# Altium footprint library PCB_ConnectorHDR.PcbLib: 129 footprints (part 7 of 9)
Each footprint in its own frame and in the unit in brackets; x right, y up, seen from the top. Pads: shape width x height; smd on the part's side, far side on the other; paste and mask are expansions set on the pad; w line width, h text height; cw(c..) or ccw(c..) is an arc to the next point about the centre after c.
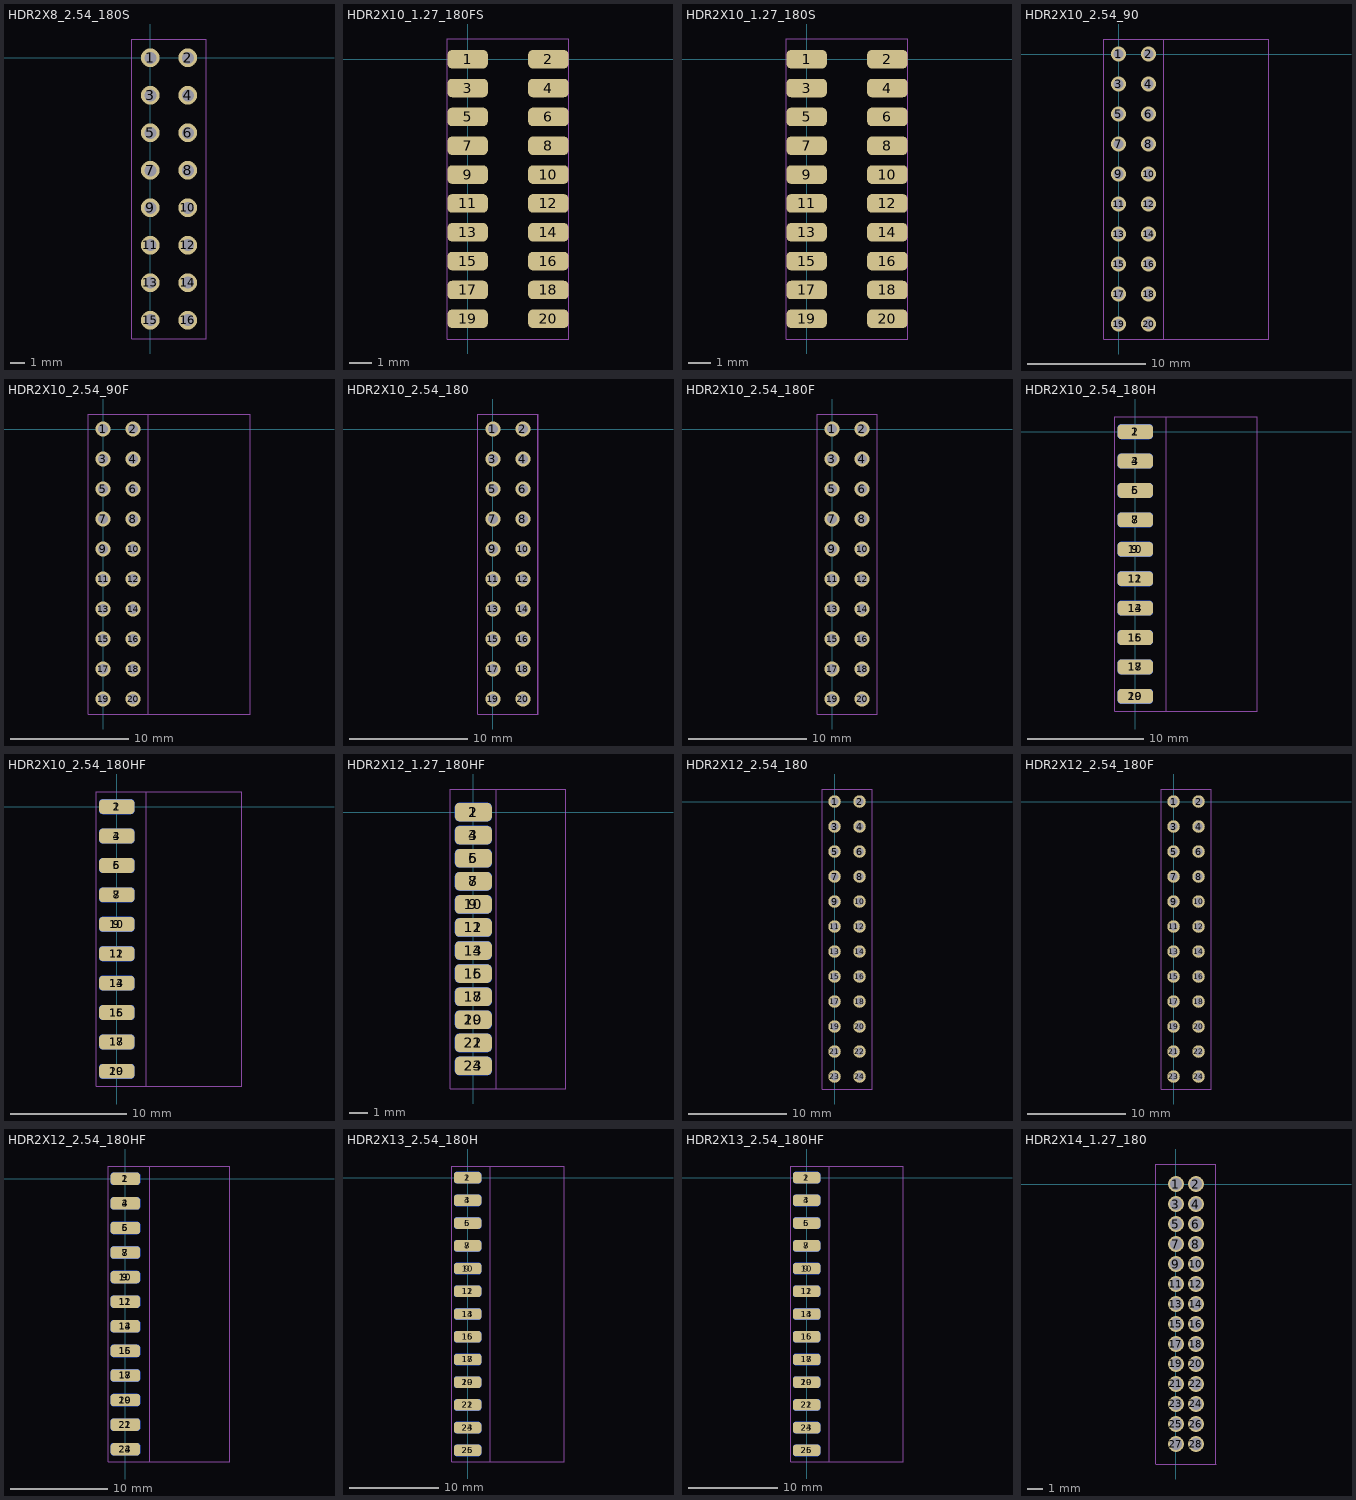
[diagram p6: the footprints below, top view; thin cyan lines are the x and y axes]

## HDR2X8_2.54_180S [mil]
height 169.29
pads (16):
  round 50 hole 32: 1(0,0) 2(100,0) 3(0,-100) 4(100,-100) 5(0,-200) 6(100,-200) 7(0,-300) 8(100,-300) 9(0,-400) 10(100,-400) 11(0,-500) 12(100,-500) 13(0,-600) 14(100,-600) 15(0,-700) 16(100,-700)
Mechanical 13:
  lines w2: -50,-750 -50,50 150,50 150,-750 -50,-750
T-Component:
  lines w2: -50,-750 -50,50 150,50 150,-750 -50,-750
  text ".Designator" at 10,-375 h50
3D body "pin_header_a-sl254-dg-g16mp1.stp": height 334.71, standoff -48.82, extent -97.64,-750 197.64,50

## HDR2X10_1.27_180FS [mil]
height 169.29
pads (20):
  rrect50% 70x32 smd: 1(0,0) 2(140,0) 3(0,-50) 4(140,-50) 5(0,-100) 6(140,-100) 7(0,-150) 8(140,-150) 9(0,-200) 10(140,-200) 11(0,-250) 12(140,-250) 13(0,-300) 14(140,-300) 15(0,-350) 16(140,-350) 17(0,-400) 18(140,-400) 19(0,-450) 20(140,-450)
Mechanical 13:
  lines w2: -35,-485 175,-485 175,35 -35,35 -35,-485
T-Component:
  lines w2: -35,-485 175,-485 175,35 -35,35 -35,-485
  text ".Designator" at 25,-250 h50
3D body "female_header_a-bl127-dg-g20mp1.stp": height 185.29, standoff 8.13, extent -20.54,-482.88 160.56,32.87

## HDR2X10_1.27_180S [mil]
height 169.29
pads (20):
  rrect50% 70x32 smd: 1(0,0) 2(140,0) 3(0,-50) 4(140,-50) 5(0,-100) 6(140,-100) 7(0,-150) 8(140,-150) 9(0,-200) 10(140,-200) 11(0,-250) 12(140,-250) 13(0,-300) 14(140,-300) 15(0,-350) 16(140,-350) 17(0,-400) 18(140,-400) 19(0,-450) 20(140,-450)
Mechanical 13:
  lines w2: -35,-485 -35,35 175,35 175,-485 -35,-485
T-Component:
  lines w2: -35,-485 -35,35 175,35 175,-485 -35,-485
  text ".Designator" at 25,-250 h50
3D body "pin_header_a-sl127-dg-g20mp1.stp": height 252.13, standoff 0.25, extent -38.31,-475 178.31,25

## HDR2X10_2.54_90 [mil]
height 169.29
pads (20):
  round 50 hole 32: 1(0,0) 2(100,0) 3(0,-100) 4(100,-100) 5(0,-200) 6(100,-200) 7(0,-300) 8(100,-300) 9(0,-400) 10(100,-400) 11(0,-500) 12(100,-500) 13(0,-600) 14(100,-600) 15(0,-700) 16(100,-700) 17(0,-800) 18(100,-800) 19(0,-900) 20(100,-900)
Mechanical 13:
  lines w2: -50,-950 500,-950 500,50 -50,50 -50,-950
T-Component:
  lines w2: -50,-950 -50,50 150,50 150,-950 -50,-950
  text ".Designator" at 10,-475 h50
3D body "pin_header_awl254-da-g20d.stp": height 198.43, standoff -116.54, extent -12.44,-950 494.65,50

## HDR2X10_2.54_90F [mil]
height 169.29
pads (20):
  round 50 hole 32: 1(0,0) 2(100,0) 3(0,-100) 4(100,-100) 5(0,-200) 6(100,-200) 7(0,-300) 8(100,-300) 9(0,-400) 10(100,-400) 11(0,-500) 12(100,-500) 13(0,-600) 14(100,-600) 15(0,-700) 16(100,-700) 17(0,-800) 18(100,-800) 19(0,-900) 20(100,-900)
Mechanical 13:
  lines w2: -50,-950 490,-950 490,50 -50,50 -50,-950
T-Component:
  lines w2: -50,-950 150,-950 150,50 -50,50 -50,-950
  text ".Designator" at 10,-475 h50
3D body "female_header_a-bl254-da-g20d.stp": height 198.43, standoff -124.41, extent -10,-954.92 486.06,54.92

## HDR2X10_2.54_180 [mil]
height 169.29
pads (20):
  round 50 hole 32: 1(0,0) 2(100,0) 3(0,-100) 4(100,-100) 5(0,-200) 6(100,-200) 7(0,-300) 8(100,-300) 9(0,-400) 10(100,-400) 11(0,-500) 12(100,-500) 13(0,-600) 14(100,-600) 15(0,-700) 16(100,-700) 17(0,-800) 18(100,-800) 19(0,-900) 20(100,-900)
Mechanical 13:
  lines w2: -50,-950 150,-950 150,50 -50,50 -50,-950
T-Component:
  lines w2: -50,-950 150,-950 150,50 -50,50 -50,-950
  text ".Designator" at 10,-475 h50
3D body "pin_header_awl254-dg-g20d.stp": height 334.65, standoff -118.11, extent -50,-950 150,50

## HDR2X10_2.54_180F [mil]
height 169.29
pads (20):
  round 50 hole 32: 1(0,0) 2(100,0) 3(0,-100) 4(100,-100) 5(0,-200) 6(100,-200) 7(0,-300) 8(100,-300) 9(0,-400) 10(100,-400) 11(0,-500) 12(100,-500) 13(0,-600) 14(100,-600) 15(0,-700) 16(100,-700) 17(0,-800) 18(100,-800) 19(0,-900) 20(100,-900)
Mechanical 13:
  lines w2: -50,-950 150,-950 150,50 -50,50 -50,-950
T-Component:
  lines w2: -50,-950 150,-950 150,50 -50,50 -50,-950
  text ".Designator" at 10,-475 h50
3D body "female_header_a-bl254-dg-g20d.stp": height 334.65, standoff -125.98, extent -48.42,-954.92 148.43,54.92

## HDR2X10_2.54_180H [mil]
height 169.29
pads (20):
  rrect50% 120x50 smd: 1(0,0) 3(0,-100) 5(0,-200) 7(0,-300) 9(0,-400) 11(0,-500) 13(0,-600) 15(0,-700) 17(0,-800) 19(0,-900)
  rrect50% 120x50 smd far side: 2(0,0) 4(0,-100) 6(0,-200) 8(0,-300) 10(0,-400) 12(0,-500) 14(0,-600) 16(0,-700) 18(0,-800) 20(0,-900)
Mechanical 13:
  lines w2: -70,-950 -70,50 415,50 415,-950 -70,-950
T-Component:
  lines w2: -70,-950 -70,50 105,50 105,-950 -70,-950
  text ".Designator" at -40,-475 h50
B-Component:
  lines w2: -70,-950 105,-950 105,50 -70,50 -70,-950
3D body "pin_header_awl254-dg-g20d.stp": height 100, standoff -100, extent -37.76,-950 415,50

## HDR2X10_2.54_180HF [mil]
height 169.29
pads (20):
  rrect50% 120x50 smd: 1(0,0) 3(0,-100) 5(0,-200) 7(0,-300) 9(0,-400) 11(0,-500) 13(0,-600) 15(0,-700) 17(0,-800) 19(0,-900)
  rrect50% 120x50 smd far side: 2(0,0) 4(0,-100) 6(0,-200) 8(0,-300) 10(0,-400) 12(0,-500) 14(0,-600) 16(0,-700) 18(0,-800) 20(0,-900)
Mechanical 13:
  lines w2: -70,-950 -70,50 425,50 425,-950 -70,-950
T-Component:
  lines w2: -70,-950 -70,50 100,50 100,-950 -70,-950
  text ".Designator" at -35,-475 h50
B-Component:
  lines w2: -70,-950 100,-950 100,50 -70,50 -70,-950
3D body "female_header_a-bl254-dg-g20d.stp": height 76.43, standoff -120.43, extent -40.98,-954.92 419.65,54.92

## HDR2X12_1.27_180HF [mil]
height 169.29
pads (24):
  rrect50% 80x40 smd: 1(0,0) 3(0,-50) 5(0,-100) 7(0,-150) 9(0,-200) 11(0,-250) 13(0,-300) 15(0,-350) 17(0,-400) 19(0,-450) 21(0,-500) 23(0,-550)
  rrect50% 80x40 smd far side: 2(0,0) 4(0,-50) 6(0,-100) 8(0,-150) 10(0,-200) 12(0,-250) 14(0,-300) 16(0,-350) 18(0,-400) 20(0,-450) 22(0,-500) 24(0,-550)
Mechanical 13:
  lines w2: -50,-600 -50,50 200,50 200,-600 -50,-600
T-Component:
  lines w2: -50,-600 -50,50 50,50 50,-600 -50,-600
  text ".Designator" at -40,-300 h50
3D body "female_header_a-bl127-dg-g24d.stp": height 39.02, standoff -83.02, extent -28.34,-582.88 200,32.87

## HDR2X12_2.54_180 [mil]
height 169.29
pads (24):
  round 50 hole 32: 1(0,0) 2(100,0) 3(0,-100) 4(100,-100) 5(0,-200) 6(100,-200) 7(0,-300) 8(100,-300) 9(0,-400) 10(100,-400) 11(0,-500) 12(100,-500) 13(0,-600) 14(100,-600) 15(0,-700) 16(100,-700) 17(0,-800) 18(100,-800) 19(0,-900) 20(100,-900) 21(0,-1000) 22(100,-1000) 23(0,-1100) 24(100,-1100)
Mechanical 13:
  lines w2: -50,-1150 150,-1150 150,50 -50,50 -50,-1150
T-Component:
  lines w2: -50,-1150 -50,50 150,50 150,-1150 -50,-1150
  text ".Designator" at 10,-575 h50
3D body "pin_header_awl254-dg-g24d.stp": height 334.65, standoff -118.11, extent -50,-1149.99 150,50.01

## HDR2X12_2.54_180F [mil]
height 169.29
pads (24):
  round 50 hole 32: 1(0,0) 2(100,0) 3(0,-100) 4(100,-100) 5(0,-200) 6(100,-200) 7(0,-300) 8(100,-300) 9(0,-400) 10(100,-400) 11(0,-500) 12(100,-500) 13(0,-600) 14(100,-600) 15(0,-700) 16(100,-700) 17(0,-800) 18(100,-800) 19(0,-900) 20(100,-900) 21(0,-1000) 22(100,-1000) 23(0,-1100) 24(100,-1100)
Mechanical 13:
  lines w2: -50,-1150 150,-1150 150,50 -50,50 -50,-1150
T-Component:
  lines w2: -50,-1150 -50,50 150,50 150,-1150 -50,-1150
  text ".Designator" at 10,-575 h50
3D body "female_header_a-bl254-dg-g24d.stp": height 334.65, standoff -125.98, extent -48.43,-1154.92 148.42,54.92

## HDR2X12_2.54_180HF [mil]
height 169.29
pads (24):
  rrect50% 120x50 smd: 1(0,0) 3(0,-100) 5(0,-200) 7(0,-300) 9(0,-400) 11(0,-500) 13(0,-600) 15(0,-700) 17(0,-800) 19(0,-900) 21(0,-1000) 23(0,-1100)
  rrect50% 120x50 smd far side: 2(0,0) 4(0,-100) 6(0,-200) 8(0,-300) 10(0,-400) 12(0,-500) 14(0,-600) 16(0,-700) 18(0,-800) 20(0,-900) 22(0,-1000) 24(0,-1100)
Mechanical 13:
  lines w2: -70,-1150 425,-1150 425,50 -70,50 -70,-1150
T-Component:
  lines w2: -70,-1150 100,-1150 100,50 -70,50 -70,-1150
  text ".Designator" at -40,-575 h50
B-Component:
  lines w2: -70,-1150 -70,50 100,50 100,-1150 -70,-1150
3D body "female_header_a-bl254-dg-g24d.stp": height 76.43, standoff -120.43, extent -35.97,-1154.92 424.66,54.92

## HDR2X13_2.54_180H [mil]
height 169.29
pads (26):
  rrect50% 120x50 smd: 1(0,0) 3(0,-100) 5(0,-200) 7(0,-300) 9(0,-400) 11(0,-500) 13(0,-600) 15(0,-700) 17(0,-800) 19(0,-900) 21(0,-1000) 23(0,-1100) 25(0,-1200)
  rrect50% 120x50 smd far side: 2(0,0) 4(0,-100) 6(0,-200) 8(0,-300) 10(0,-400) 12(0,-500) 14(0,-600) 16(0,-700) 18(0,-800) 20(0,-900) 22(0,-1000) 24(0,-1100) 26(0,-1200)
Mechanical 13:
  lines w2: -70,-1250 -70,50 425,50 425,-1250 -70,-1250
T-Component:
  lines w2: -70,-1250 -70,50 100,50 100,-1250 -70,-1250
  text ".Designator" at -40,-625 h50
B-Component:
  lines w2: -70,-1250 -70,50 100,50 100,-1250 -70,-1250
3D body "pin_header_awl254-dg-g26d.stp": height 100, standoff -100, extent -36.38,-1250 416.38,50

## HDR2X13_2.54_180HF [mil]
height 169.29
pads (26):
  rrect50% 120x50 smd: 1(0,0) 3(0,-100) 5(0,-200) 7(0,-300) 9(0,-400) 11(0,-500) 13(0,-600) 15(0,-700) 17(0,-800) 19(0,-900) 21(0,-1000) 23(0,-1100) 25(0,-1200)
  rrect50% 120x50 smd far side: 2(0,0) 4(0,-100) 6(0,-200) 8(0,-300) 10(0,-400) 12(0,-500) 14(0,-600) 16(0,-700) 18(0,-800) 20(0,-900) 22(0,-1000) 24(0,-1100) 26(0,-1200)
Mechanical 13:
  lines w2: -70,-1250 425,-1250 425,50 -70,50 -70,-1250
T-Component:
  lines w2: -70,-1250 100,-1250 100,50 -70,50 -70,-1250
  text ".Designator" at -40,-625 h50
B-Component:
  lines w2: -70,-1250 100,-1250 100,50 -70,50 -70,-1250
3D body "female_header_a-bl254-dg-g26d.stp": height 76.43, standoff -120.43, extent -35.98,-1254.92 424.65,54.92

## HDR2X14_1.27_180 [mil]
height 169.29
pads (28):
  round 40 hole 30: 1(0,0) 2(50,0) 3(0,-50) 4(50,-50) 5(0,-100) 6(50,-100) 7(0,-150) 8(50,-150) 9(0,-200) 10(50,-200) 11(0,-250) 12(50,-250) 13(0,-300) 14(50,-300) 15(0,-350) 16(50,-350) 17(0,-400) 18(50,-400) 19(0,-450) 20(50,-450) 21(0,-500) 22(50,-500) 23(0,-550) 24(50,-550) 25(0,-600) 26(50,-600) 27(0,-650) 28(50,-650)
Mechanical 13:
  lines w2: -50,-700 100,-700 100,50 -50,50 -50,-700
T-Component:
  lines w2: -50,-700 100,-700 100,50 -50,50 -50,-700
  text ".Designator" at -15,-350 h50
3D body "pin_header_a-sl127-dg-g28d.stp": height 210.24, standoff -102.36, extent -73.42,-674.99 123.43,25.01